# Altium schematic symbol library IC_ADI.SCHLIB: 3169 symbols (part 4 of 181)
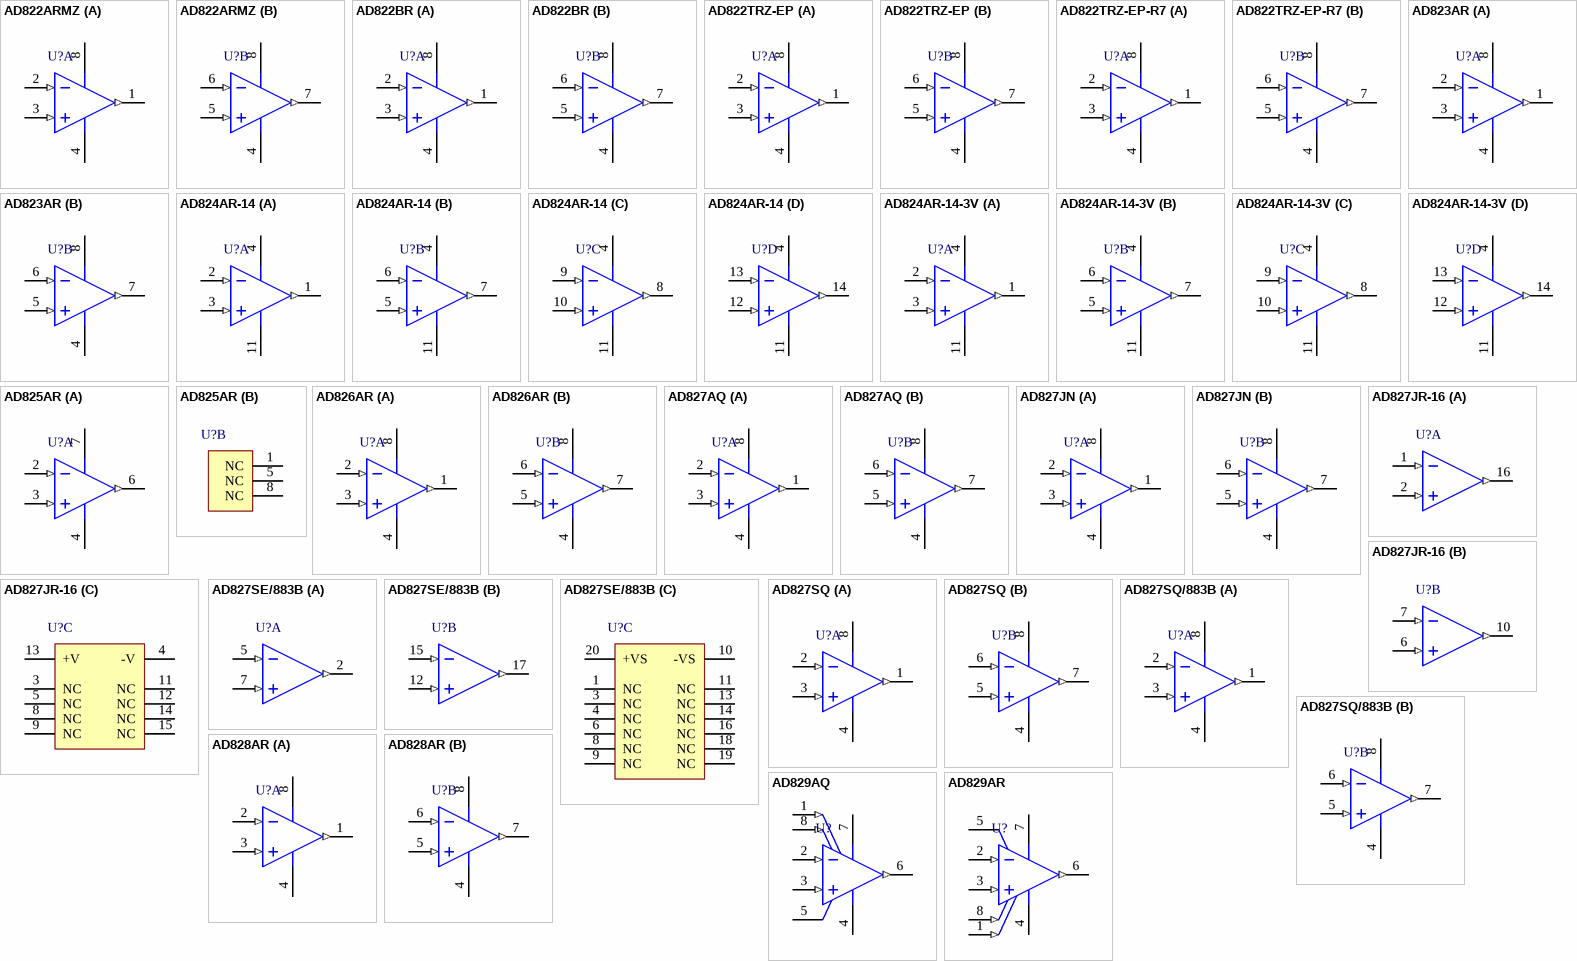
[diagram p194: symbols AD822ARMZ to AD829AR]

## AD825AR
designator U?
Single Channel Low Distortion Operational Amplifier, 46 MHz BW, 140 V/us SR, Industrial, 8-pin SOIC (R-8), Tube; Generic Part Number: AD825; PartNumber: AD825AR; Amplifiers Per Package: 1; Input Bias Current: 10pA; Input Offset Voltage: 1mV; Iq/Amp: 7.2mA; Small Signal Bandwidth: 46MHz; V Span Max: 36V; V Span Min: 10V; DatasheetVersion: Rev. F; PackageVersion: 060506-A; PackageReference: R-8; PackageDescription: 8-Pin Standard Small Outline Package, Body 3.9 x 4.9 mm, Pitch 1.27 mm; Supplier Part Number 1: AD825AR-ND; Packing: Tube; Slew Rate: 140V/us; Mounting Technology: Surface Mount; Code_JEDEC: MS-012-AA; ComponentLink1Description: Manufacturer URL; ComponentLink2Description: Datasheet; ComponentLink3Description: Package Specification
footprint SOIC8_1.27 (Footprint not found)
part A pins: 2 -IN (in), 3 +IN (in), 4 -VS (power), 6 OUT (out), 7 +VS (power)
part B pins: 1 NC, 5 NC, 8 NC

## AD826AR
designator U?
Double Channel Low Power Operational Amplifier, 50 MHz BW, 350 V/us SR, Industrial, 8-pin SOIC (R-8), Tube; Generic Part Number: AD826; PartNumber: AD826AR; Amplifiers Per Package: 2; Input Bias Current: 3.3uA; Input Offset Voltage: 500uV; Iq/Amp: 7.5mA; Small Signal Bandwidth: 50MHz; V Span Max: 36V; V Span Min: 5V; DatasheetVersion: Rev. C; PackageVersion: 060506-A; PackageReference: R-8; PackageDescription: 8-Pin Standard Small Outline Package, Body 3.9 x 4.9 mm, Pitch 1.27 mm; Supplier Part Number 1: AD826AR-ND; Slew Rate: 350V/us; Mounting Technology: Surface Mount; Code_JEDEC: MS-012-AA; ComponentLink1Description: Manufacturer URL; ComponentLink2Description: Datasheet; ComponentLink3Description: Package Specification
footprint SOIC8_1.27 (Footprint not found)
pins on every part: 4 -V (power), 8 +V (power)
part A pins: 1 OUT 1 (out), 2 -IN 1 (in), 3 +IN 1 (in)
part B pins: 5 +IN 2 (in), 6 -IN 2 (in), 7 OUT 2 (out)

## AD827AQ
designator U?
Double Channel Low Power Operational Amplifier, 50 MHz BW, 300 V/us SR, Industrial, 8-pin DIP (Q-8), Tube; Generic Part Number: AD827; PartNumber: AD827AQ; Amplifiers Per Package: 2; Input Bias Current: 3.3uA; Input Offset Voltage: 500uV; Iq/Amp: 6.75mA; Small Signal Bandwidth: 50MHz; V Span Max: 36V; V Span Min: 9V; DatasheetVersion: Rev. C; PackageReference: Q-8; PackageDescription: 8-Pin Ceramic Dual In-Line Package, Row spacing 7.62 mm, Pitch 2.54 mm; Supplier Part Number 1: AD827AQ-ND; Supplier Part Number 2: 09B6522; Packing: Tube; Slew Rate: 300V/us; Mounting Technology: Through Hole; ComponentLink1Description: Manufacturer URL; ComponentLink2Description: Datasheet; ComponentLink3Description: Package Specification
footprint DIP8 (Footprint not found)
pins on every part: 4 -V (power), 8 +V (power)
part A pins: 1 OUT 1 (out), 2 -IN 1 (in), 3 +IN 1 (in)
part B pins: 5 +IN 2 (in), 6 -IN 2 (in), 7 OUT 2 (out)

## AD827JN
designator U?
Double Channel Low Power Operational Amplifier, 50 MHz BW, 300 V/us SR, Commercial, 8-pin DIP (N-8), Tube; Generic Part Number: AD827; PartNumber: AD827JN; Amplifiers Per Package: 2; Input Bias Current: 3.3uA; Input Offset Voltage: 500uV; Iq/Amp: 6.75mA; Small Signal Bandwidth: 50MHz; V Span Max: 36V; V Span Min: 9V; DatasheetVersion: Rev. C; PackageVersion: 070606-A; PackageReference: N-8; PackageDescription: 8-Pin Plastic Dual In-Line Package, Row spacing 7.62 mm, Pitch 2.54 mm; Supplier Part Number 1: AD827JN-ND; Packing: Tube; Slew Rate: 300V/us; Mounting Technology: Through Hole; Code_JEDEC: MS-001; ComponentLink1Description: Manufacturer URL; ComponentLink2Description: Datasheet; ComponentLink3Description: Package Specification
footprint DIP8 (Footprint not found)
pins on every part: 4 -V (power), 8 +V (power)
part A pins: 1 OUT 1 (out), 2 -IN 1 (in), 3 +IN 1 (in)
part B pins: 5 +IN 2 (in), 6 -IN 2 (in), 7 OUT 2 (out)

## AD827JR-16
designator U?
Double Channel Low Power Operational Amplifier, 50 MHz BW, 300 V/us SR, Commercial, 16-pin SOIC (RW-16), Tube; Generic Part Number: AD827; PartNumber: AD827JR-16; Amplifiers Per Package: 2; Input Bias Current: 3.3uA; Input Offset Voltage: 500uV; Iq/Amp: 6.75mA; Small Signal Bandwidth: 50MHz; V Span Max: 36V; V Span Min: 9V; DatasheetVersion: Rev. C; PackageVersion: 032707-B; PackageReference: RW-16; PackageDescription: 16-Pin Standard Small Outline Package, Body 10.3 x 7.5 mm, Pitch 1.27 mm; Supplier Part Number 1: AD827JR-16-ND; Supplier Part Number 2: 05F7691; Packing: Tube; Slew Rate: 300V/us; Mounting Technology: Surface Mount; Code_JEDEC: MS-013-AA; ComponentLink1Description: Manufacturer URL; ComponentLink2Description: Datasheet; ComponentLink3Description: Package Specification
footprint SOIC16W_1.27 (Footprint not found)
part A pins: 1 -IN 1 (in), 2 +IN 1 (in), 16 OUT 1 (out)
part B pins: 6 +IN 2 (in), 7 -IN 2 (in), 10 OUT 2 (out)
part C pins: 3 NC, 4 -V (power), 5 NC, 8 NC, 9 NC, 11 NC, 12 NC, 13 +V (power), 14 NC, 15 NC

## AD827SE/883B
designator U?
Double Channel Low Power Operational Amplifier, 50 MHz BW, 300 V/us SR, Military, 20-pin LCC (E-20A), Tube; Generic Part Number: AD827; PartNumber: AD827SE/883B; Amplifiers Per Package: 2; Input Bias Current: 3.3uA; Input Offset Voltage: 500uV; Iq/Amp: 6.75mA; Small Signal Bandwidth: 50MHz; V Span Max: 36V; V Span Min: 9V; DatasheetVersion: Rev. C; PackageVersion: Rev. C; PackageReference: E-20A; PackageDescription: 20-Pin Terminal Ceramic Leadless Chip Carrier, Body 8.89 x 8.89 mm, Pitch 1.27 mm; Supplier Part Number 1: AD827SE/883B-ND; Packing: Tube; Slew Rate: 300V/us; Mounting Technology: Surface Mount; ComponentLink1Description: Manufacturer URL; ComponentLink2Description: Datasheet; ComponentLink3Description: Package Specification
footprint PLCC-20N (Footprint not found)
part A pins: 2 OUTPUT A (out), 5 -IN A (in), 7 +IN A (in)
part B pins: 12 +IN B (in), 15 -IN B (in), 17 OUTPUT B (out)
part C pins: 1 NC, 3 NC, 4 NC, 6 NC, 8 NC, 9 NC, 10 -VS (power), 11 NC, 13 NC, 14 NC, 16 NC, 18 NC, 19 NC, 20 +VS (power)

## AD827SQ
designator U?
Double Channel Low Power Operational Amplifier, 50 MHz BW, 300 V/us SR, Military, 8-pin DIP (Q-8), Tube; Generic Part Number: AD827; PartNumber: AD827SQ; Amplifiers Per Package: 2; Input Bias Current: 3.3uA; Input Offset Voltage: 500uV; Iq/Amp: 6.75mA; Small Signal Bandwidth: 50MHz; V Span Max: 36V; V Span Min: 9V; DatasheetVersion: Rev. C; PackageReference: Q-8; PackageDescription: 8-Pin Ceramic Dual In-Line Package, Row spacing 7.62 mm, Pitch 2.54 mm; Supplier Part Number 1: AD827SQ-ND; Packing: Tube; Slew Rate: 300V/us; Mounting Technology: Through Hole; ComponentLink1Description: Manufacturer URL; ComponentLink2Description: Datasheet; ComponentLink3Description: Package Specification
footprint DIP8 (Footprint not found)
pins on every part: 4 -V (power), 8 +V (power)
part A pins: 1 OUT 1 (out), 2 -IN 1 (in), 3 +IN 1 (in)
part B pins: 5 +IN 2 (in), 6 -IN 2 (in), 7 OUT 2 (out)

## AD827SQ/883B
designator U?
Double Channel Low Power Operational Amplifier, 50 MHz BW, 300 V/us SR, Military, 8-pin DIP (Q-8), Tube; Generic Part Number: AD827; PartNumber: AD827SQ/883B; Amplifiers Per Package: 2; Input Bias Current: 3.3uA; Input Offset Voltage: 500uV; Iq/Amp: 6.75mA; Small Signal Bandwidth: 50MHz; V Span Max: 36V; V Span Min: 9V; DatasheetVersion: Rev. C; PackageReference: Q-8; PackageDescription: 8-Pin Ceramic Dual In-Line Package, Row spacing 7.62 mm, Pitch 2.54 mm; Supplier Part Number 1: AD827SQ/883B-ND; Packing: Tube; Slew Rate: 300V/us; Mounting Technology: Through Hole; ComponentLink1Description: Manufacturer URL; ComponentLink2Description: Datasheet; ComponentLink3Description: Package Specification
footprint DIP8 (Footprint not found)
pins on every part: 4 -V (power), 8 +V (power)
part A pins: 1 OUT 1 (out), 2 -IN 1 (in), 3 +IN 1 (in)
part B pins: 5 +IN 2 (in), 6 -IN 2 (in), 7 OUT 2 (out)

## AD828AR
designator U?
Double Channel Low Power Operational Amplifier, 130 MHz BW, 450 V/us SR, Industrial, 8-pin SOIC (R-8), Tube; Generic Part Number: AD828; PartNumber: AD828AR; Amplifiers Per Package: 2; Input Bias Current: 3.3uA; Input Offset Voltage: 500uV; Iq/Amp: 7.5mA; Small Signal Bandwidth: 130MHz; V Span Max: 36V; V Span Min: 5V; DatasheetVersion: Rev. C; PackageVersion: 060506-A; PackageReference: R-8; PackageDescription: 8-Pin Standard Small Outline Package, Body 3.9 x 4.9 mm, Pitch 1.27 mm; Supplier Part Number 1: AD828AR-ND; Slew Rate: 450V/us; Mounting Technology: Surface Mount; Code_JEDEC: MS-012-AA; ComponentLink1Description: Manufacturer URL; ComponentLink2Description: Datasheet; ComponentLink3Description: Package Specification
footprint SOIC8_1.27 (Footprint not found)
pins on every part: 4 -V (power), 8 +V (power)
part A pins: 1 OUT 1 (out), 2 -IN 1 (in), 3 +IN 1 (in)
part B pins: 5 +IN 2 (in), 6 -IN 2 (in), 7 OUT 2 (out)

## AD829AQ
designator U?
Single Channel Low Noise Operational Amplifier, 120 MHz BW, 230 V/us SR, Industrial, 8-pin DIP (Q-8), Tube; Generic Part Number: AD829; PartNumber: AD829AQ; Amplifiers Per Package: 1; Input Bias Current: 3.3uA; Input Offset Voltage: 100uV; Iq/Amp: 6.5mA; Small Signal Bandwidth: 120MHz; V Span Max: 36V; V Span Min: 9V; DatasheetVersion: Rev. I; PackageReference: Q-8; PackageDescription: 8-Pin Ceramic Dual In-Line Package, Row spacing 7.62 mm, Pitch 2.54 mm; Supplier Part Number 1: AD829AQ-ND; Supplier Part Number 2: 05F7694; Packing: Tube; Slew Rate: 230V/us; Mounting Technology: Through Hole; ComponentLink1Description: Manufacturer URL; ComponentLink2Description: Datasheet; ComponentLink3Description: Package Specification
footprint DIP8 (Footprint not found)
pins: 1 OFFSET NULL (in), 2 -IN (in), 3 +IN (in), 4 -VS (power), 5 CCOMP, 6 OUT (out), 7 +VS (power), 8 OFFSET NULL (in)

## AD829AR
designator U?
Single Channel Low Noise Operational Amplifier, 120 MHz BW, 230 V/us SR, Industrial, 8-pin SOIC (R-8), Tube; Generic Part Number: AD829; PartNumber: AD829AR; Amplifiers Per Package: 1; Input Bias Current: 3.3uA; Input Offset Voltage: 200uV; Iq/Amp: 6.5mA; Small Signal Bandwidth: 120MHz; V Span Max: 36V; V Span Min: 9V; DatasheetVersion: Rev. I; PackageVersion: 060506-A; PackageReference: R-8; PackageDescription: 8-Pin Standard Small Outline Package, Body 3.9 x 4.9 mm, Pitch 1.27 mm; Supplier Part Number 1: AD829AR-ND; Packing: Tube; Slew Rate: 230V/us; Mounting Technology: Surface Mount; Code_JEDEC: MS-012-AA; ComponentLink1Description: Manufacturer URL; ComponentLink2Description: Datasheet; ComponentLink3Description: Package Specification
footprint SOIC8_1.27 (Footprint not found)
pins: 1 OFFSET NULL (in), 2 -IN (in), 3 +IN (in), 4 -VS (power), 5 CCOMP, 6 OUT (out), 7 +VS (power), 8 OFFSET NULL (in)

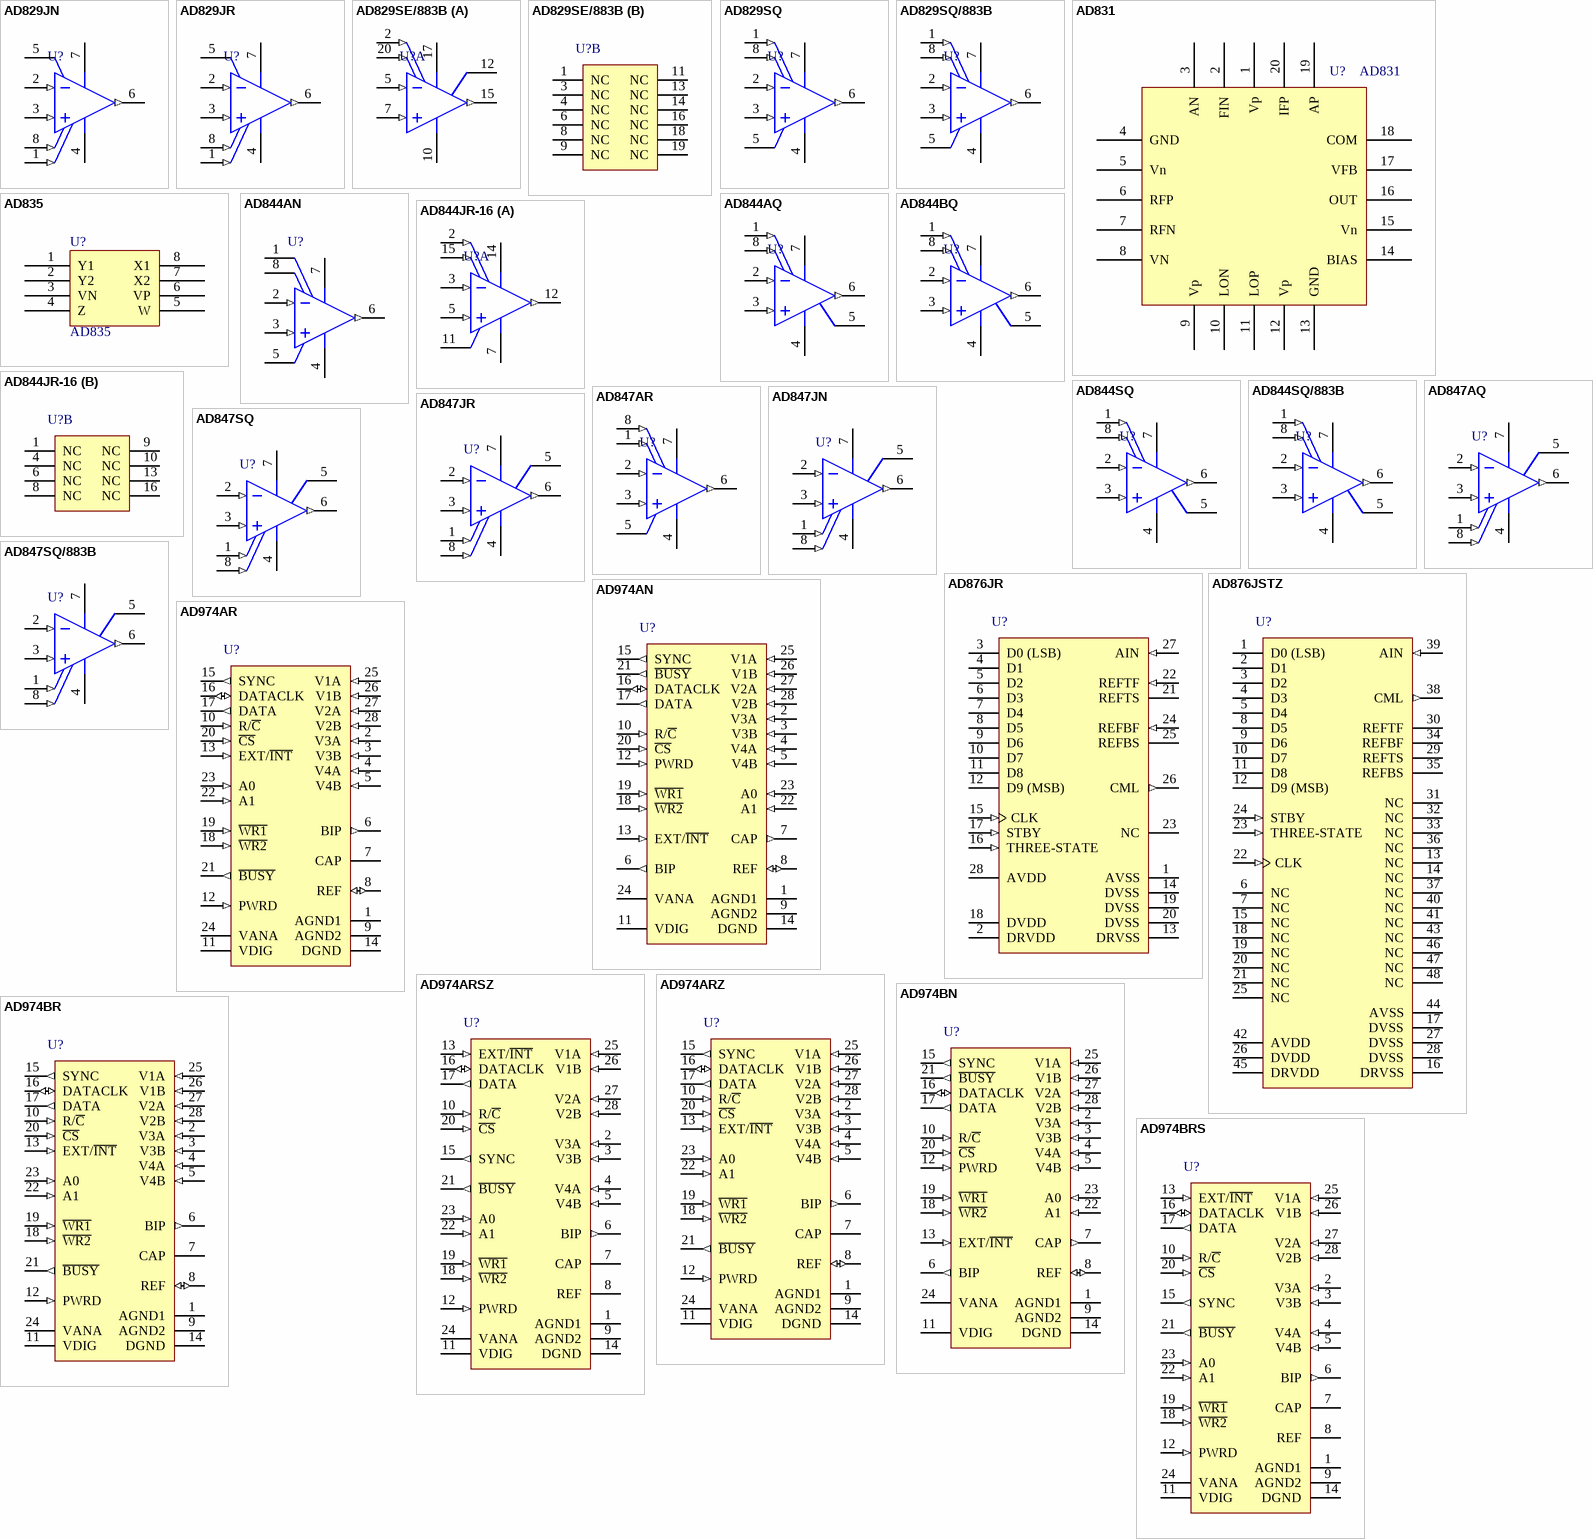
[diagram p8: symbols AD829JN to AD974BRS]

## AD829JN
designator U?
Single Channel Low Noise Operational Amplifier, 120 MHz BW, 230 V/us SR, Commercial, 8-pin DIP (N-8), Tube; Generic Part Number: AD829; PartNumber: AD829JN; Amplifiers Per Package: 1; Input Bias Current: 3.3uA; Input Offset Voltage: 200uV; Iq/Amp: 6.5mA; Small Signal Bandwidth: 120MHz; V Span Max: 36V; V Span Min: 9V; DatasheetVersion: Rev. I; PackageVersion: 070606-A; PackageReference: N-8; PackageDescription: 8-Pin Plastic Dual In-Line Package, Row spacing 7.62 mm, Pitch 2.54 mm; Supplier Part Number 1: AD829JN-ND; Packing: Tube; Slew Rate: 230V/us; Mounting Technology: Through Hole; Code_JEDEC: MS-001; ComponentLink1Description: Manufacturer URL; ComponentLink2Description: Datasheet; ComponentLink3Description: Package Specification
footprint DIP8 (Footprint not found)
pins: 1 OFFSET NULL (in), 2 -IN (in), 3 +IN (in), 4 -VS (power), 5 CCOMP, 6 OUT (out), 7 +VS (power), 8 OFFSET NULL (in)

## AD829JR
designator U?
Single Channel Low Noise Operational Amplifier, 120 MHz BW, 230 V/us SR, Commercial, 8-pin SOIC (R-8), Tube; Generic Part Number: AD829; PartNumber: AD829JR; Amplifiers Per Package: 1; Input Bias Current: 3.3uA; Input Offset Voltage: 200uV; Iq/Amp: 6.5mA; Small Signal Bandwidth: 120MHz; V Span Max: 36V; V Span Min: 9V; DatasheetVersion: Rev. I; PackageVersion: 060506-A; PackageReference: R-8; PackageDescription: 8-Pin Standard Small Outline Package, Body 3.9 x 4.9 mm, Pitch 1.27 mm; Supplier Part Number 1: AD829JR-ND; Packing: Tube; Slew Rate: 230V/us; Mounting Technology: Surface Mount; Code_JEDEC: MS-012-AA; ComponentLink1Description: Manufacturer URL; ComponentLink2Description: Datasheet; ComponentLink3Description: Package Specification
footprint SOIC8_1.27 (Footprint not found)
pins: 1 OFFSET NULL (in), 2 -IN (in), 3 +IN (in), 4 -VS (power), 5 CCOMP, 6 OUT (out), 7 +VS (power), 8 OFFSET NULL (in)

## AD829SE/883B
designator U?
Single Channel Low Noise Operational Amplifier, 120 MHz BW, 230 V/us SR, Military, 20-pin LCC (E-20-1), Tube; Generic Part Number: AD829; PartNumber: AD829SE/883B; Amplifiers Per Package: 1; Input Bias Current: 3.3uA; Input Offset Voltage: 100uV; Iq/Amp: 6.5mA; Small Signal Bandwidth: 120MHz; V Span Max: 36V; V Span Min: 9V; DatasheetVersion: Rev. I; PackageVersion: 022106-A; PackageReference: E-20-1; PackageDescription: 20-Terminal Ceramic Leadless Chip Carrier, Body 8.89 x 8.89 mm, Pitch 1.27 mm; Supplier Part Number 1: AD829SE/883B-ND; Packing: Tube; Slew Rate: 230V/us; Mounting Technology: Surface Mount; ComponentLink1Description: Manufacturer URL; ComponentLink2Description: Datasheet; ComponentLink3Description: Package Specification
footprint PLCC-20N (Footprint not found)
part A pins: 2 OFFSET NULL (in), 5 -IN (in), 7 +IN (in), 10 -V (power), 12 CCOMP, 15 OUT (out), 17 +V (power), 20 OFFSET NULL (in)
part B pins: 1 NC, 3 NC, 4 NC, 6 NC, 8 NC, 9 NC, 11 NC, 13 NC, 14 NC, 16 NC, 18 NC, 19 NC

## AD829SQ
designator U?
Single Channel Low Noise Operational Amplifier, 120 MHz BW, 230 V/us SR, Military, 8-pin DIP (Q-8), Tube; Generic Part Number: AD829; PartNumber: AD829SQ; Amplifiers Per Package: 1; Input Bias Current: 3.3uA; Input Offset Voltage: 100uV; Iq/Amp: 6.5mA; Small Signal Bandwidth: 120MHz; V Span Max: 36V; V Span Min: 9V; DatasheetVersion: Rev. I; PackageReference: Q-8; PackageDescription: 8-Pin Ceramic Dual In-Line Package, Row spacing 7.62 mm, Pitch 2.54 mm; Supplier Part Number 1: AD829SQ-ND; Supplier Part Number 2: 02H1879; Packing: Tube; Slew Rate: 230V/us; Mounting Technology: Through Hole; ComponentLink1Description: Manufacturer URL; ComponentLink2Description: Datasheet; ComponentLink3Description: Package Specification
footprint DIP8 (Footprint not found)
pins: 1 OFFSET NULL (in), 2 -IN (in), 3 +IN (in), 4 -VS (power), 5 CCOMP, 6 OUT (out), 7 +VS (power), 8 OFFSET NULL (in)

## AD829SQ/883B
designator U?
Single Channel Low Noise Operational Amplifier, 120 MHz BW, 230 V/us SR, Military, 8-pin DIP (Q-8), Tube; Generic Part Number: AD829; PartNumber: AD829SQ/883B; Amplifiers Per Package: 1; Input Bias Current: 3.3uA; Input Offset Voltage: 100uV; Iq/Amp: 6.5mA; Small Signal Bandwidth: 120MHz; V Span Max: 36V; V Span Min: 9V; DatasheetVersion: Rev. I; PackageReference: Q-8; PackageDescription: 8-Pin Ceramic Dual In-Line Package, Row spacing 7.62 mm, Pitch 2.54 mm; Supplier Part Number 1: AD829SQ/883B-ND; Packing: Tube; Slew Rate: 230V/us; Mounting Technology: Through Hole; ComponentLink1Description: Manufacturer URL; ComponentLink2Description: Datasheet; ComponentLink3Description: Package Specification
footprint DIP8 (Footprint not found)
pins: 1 OFFSET NULL (in), 2 -IN (in), 3 +IN (in), 4 -VS (power), 5 CCOMP, 6 OUT (out), 7 +VS (power), 8 OFFSET NULL (in)

## AD831
designator U?
footprint PLCC-20N (PLCC, 44-Leads, Body 17.6x17.6mm (max), Pitch 1.270mm, IPC Medium Density)
pins: 1 Vp, 2 FIN, 3 AN, 4 GND, 5 Vn, 6 RFP, 7 RFN, 8 VN, 9 Vp, 10 LON, 11 LOP, 12 Vp, 13 GND, 14 BIAS, 15 Vn, 16 OUT, 17 VFB, 18 COM, 19 AP, 20 IFP

## AD835
designator U?
footprint SOIC8_1.27 (SOP, 8-Leads, Pitch 1.27mm)
pins: 1 Y1, 2 Y2, 3 VN, 4 Z, 5 W, 6 VP, 7 X2, 8 X1

## AD844AN
designator U?
Single Channel Wide Bandwidth Operational Amplifier, 60 MHz BW, 2 KV/us SR, Industrial, 8-pin DIP (N-8), Tube; Generic Part Number: AD844; PartNumber: AD844AN; Amplifiers Per Package: 1; Input Bias Current: 150nA; Input Offset Voltage: 50uV; Iq/Amp: 6.5mA; Slew Rate: 2KV/us; Small Signal Bandwidth: 60MHz; V Span Max: 36V; V Span Min: 9V; DatasheetVersion: Rev. F; PackageVersion: 070606-A; PackageReference: N-8; PackageDescription: 8-Pin Plastic Dual In-Line Package, Row spacing 7.62 mm, Pitch 2.54 mm; Supplier Part Number 1: AD844AN-ND; Packing: Tube; Mounting Technology: Through Hole; Code_JEDEC: MS-001; ComponentLink1Description: Manufacturer URL; ComponentLink2Description: Datasheet; ComponentLink3Description: Package Specification
footprint DIP8 (Footprint not found)
pins: 1 NULL, 2 -IN (in), 3 +IN (in), 4 -VS (power), 5 TZ, 6 OUTPUT (out), 7 +VS (power), 8 NULL

## AD844AQ
designator U?
Single Channel Wide Bandwidth Operational Amplifier, 60 MHz BW, 2 KV/us SR, Industrial, 8-pin DIP (Q-8), Tube; Generic Part Number: AD844; PartNumber: AD844AQ; Amplifiers Per Package: 1; Input Bias Current: 150nA; Input Offset Voltage: 50uV; Iq/Amp: 6.5mA; Slew Rate: 2KV/us; Small Signal Bandwidth: 60MHz; V Span Max: 36V; V Span Min: 9V; DatasheetVersion: Rev. F; PackageReference: Q-8; PackageDescription: 8-Pin Ceramic Dual In-Line Package, Row spacing 7.62 mm, Pitch 2.54 mm; Supplier Part Number 1: AD844AQ-ND; Supplier Part Number 2: 09B6611; Packing: Tube; Mounting Technology: Through Hole; ComponentLink1Description: Manufacturer URL; ComponentLink2Description: Datasheet; ComponentLink3Description: Package Specification
footprint DIP8 (Footprint not found)
pins: 1 NULL (in), 2 -IN (in), 3 +IN (in), 4 -VS (power), 5 TZ, 6 OUT (out), 7 +VS (power), 8 NULL (in)

## AD844BQ
designator U?
Single Channel Wide Bandwidth Operational Amplifier, 60 MHz BW, 2 KV/us SR, Industrial, 8-pin DIP (Q-8), Tube; Generic Part Number: AD844; PartNumber: AD844BQ; Amplifiers Per Package: 1; Input Bias Current: 100nA; Input Offset Voltage: 50uV; Iq/Amp: 6.5mA; Slew Rate: 2KV/us; Small Signal Bandwidth: 60MHz; V Span Max: 36V; V Span Min: 9V; DatasheetVersion: Rev. F; PackageReference: Q-8; PackageDescription: 8-Pin Ceramic Dual In-Line Package, Row spacing 7.62 mm, Pitch 2.54 mm; Supplier Part Number 1: AD844BQ-ND; Supplier Part Number 2: 16F6548; Packing: Tube; Mounting Technology: Through Hole; ComponentLink1Description: Manufacturer URL; ComponentLink2Description: Datasheet; ComponentLink3Description: Package Specification
footprint DIP8 (Footprint not found)
pins: 1 NULL (in), 2 -IN (in), 3 +IN (in), 4 -VS (power), 5 TZ, 6 OUT (out), 7 +VS (power), 8 NULL (in)

## AD844JR-16
designator U?
Single Channel Wide Bandwidth Operational Amplifier, 60 MHz BW, 2 KV/us SR, Commercial, 16-pin SOIC (RW-16), Tube; Generic Part Number: AD844; PartNumber: AD844JR-16; Amplifiers Per Package: 1; Input Bias Current: 150nA; Input Offset Voltage: 50uV; Iq/Amp: 6.5mA; Slew Rate: 2KV/us; Small Signal Bandwidth: 60MHz; V Span Max: 36V; V Span Min: 9V; DatasheetVersion: Rev. F; PackageVersion: 032707-B; PackageReference: RW-16; PackageDescription: 16-Pin Standard Small Outline Package, Body 10.3 x 7.5 mm, Pitch 1.27 mm; Supplier Part Number 1: AD844JR-16-ND; Packing: Tube; Mounting Technology: Surface Mount; Code_JEDEC: MS-013-AA; ComponentLink1Description: Manufacturer URL; ComponentLink2Description: Datasheet; ComponentLink3Description: Package Specification
footprint SOIC16W_1.27 (Footprint not found)
part A pins: 2 OFFSET NULL (in), 3 -IN (in), 5 +IN (in), 7 -V (power), 11 TZ, 12 OUT (out), 14 +V (power), 15 OFFSET NULL (in)
part B pins: 1 NC, 4 NC, 6 NC, 8 NC, 9 NC, 10 NC, 13 NC, 16 NC

## AD844SQ
designator U?
Single Channel Wide Bandwidth Operational Amplifier, 60 MHz BW, 2 KV/us SR, Military, 8-pin DIP (Q-8), Tube; Generic Part Number: AD844; PartNumber: AD844SQ; Amplifiers Per Package: 1; Input Bias Current: 100nA; Input Offset Voltage: 50uV; Iq/Amp: 6.5mA; Slew Rate: 2KV/us; Small Signal Bandwidth: 60MHz; V Span Max: 36V; V Span Min: 9V; DatasheetVersion: Rev. F; PackageReference: Q-8; PackageDescription: 8-Pin Ceramic Dual In-Line Package, Row spacing 7.62 mm, Pitch 2.54 mm; Supplier Part Number 1: AD844SQ-ND; Supplier Part Number 2: 09B6614; Packing: Tube; Mounting Technology: Through Hole; ComponentLink1Description: Manufacturer URL; ComponentLink2Description: Datasheet; ComponentLink3Description: Package Specification
footprint DIP8 (Footprint not found)
pins: 1 NULL (in), 2 -IN (in), 3 +IN (in), 4 -VS (power), 5 TZ, 6 OUT (out), 7 +VS (power), 8 NULL (in)

## AD844SQ/883B
designator U?
Single Channel Wide Bandwidth Operational Amplifier, 60 MHz BW, 2 KV/us SR, Military, 8-pin DIP (Q-8), Tube; Generic Part Number: AD844; PartNumber: AD844SQ/883B; Amplifiers Per Package: 1; Input Bias Current: 100nA; Input Offset Voltage: 50uV; Iq/Amp: 6.5mA; Slew Rate: 2KV/us; Small Signal Bandwidth: 60MHz; V Span Max: 36V; V Span Min: 9V; DatasheetVersion: Rev. F; PackageReference: Q-8; PackageDescription: 8-Pin Ceramic Dual In-Line Package, Row spacing 7.62 mm, Pitch 2.54 mm; Supplier Part Number 1: 55368S6217635N4771; Supplier Part Number 2: AD844SQ/883B-ND; Packing: Tube; Mounting Technology: Through Hole; ComponentLink1Description: Manufacturer URL; ComponentLink2Description: Datasheet; ComponentLink3Description: Package Specification
footprint DIP8 (Footprint not found)
pins: 1 NULL (in), 2 -IN (in), 3 +IN (in), 4 -VS (power), 5 TZ, 6 OUT (out), 7 +VS (power), 8 NULL (in)

## AD847AQ
designator U?
Single Channel Superior Performance, High Unity Gain Operational Amplifier, 50 MHz BW, 300 V/us SR, Industrial, 8-pin DIP (Q-8), Tube; Generic Part Number: AD847; PartNumber: AD847AQ; Amplifiers Per Package: 1; Input Bias Current: 3.3uA; Input Offset Voltage: 500uV; Iq/Amp: 4.8mA; Small Signal Bandwidth: 50MHz; V Span Max: 36V; V Span Min: 9V; DatasheetVersion: Rev. F; PackageReference: Q-8; PackageDescription: 8-Pin Ceramic Dual In-Line Package, Row spacing 7.62 mm, Pitch 2.54 mm; Supplier Part Number 1: AD847AQ-ND; Supplier Part Number 2: 1464950; Supplier Part Number 3: 05F7723; Packing: Tube; Slew Rate: 300V/us; Mounting Technology: Through Hole; ComponentLink1Description: Manufacturer URL; ComponentLink2Description: Datasheet; ComponentLink3Description: Package Specification
footprint DIP8 (Footprint not found)
pins: 1 NULL (in), 2 -IN (in), 3 +IN (in), 4 -VS (power), 5 NC, 6 OUT (out), 7 +VS (power), 8 NULL (in)

## AD847AR
designator U?
Single Channel Superior Performance, High Unity Gain Operational Amplifier, 50 MHz BW, 300 V/us SR, Industrial, 8-pin SOIC (R-8), Tube; Generic Part Number: AD847; PartNumber: AD847AR; Amplifiers Per Package: 1; Input Bias Current: 3.3uA; Input Offset Voltage: 500uV; Iq/Amp: 4.8mA; Small Signal Bandwidth: 50MHz; V Span Max: 36V; V Span Min: 9V; DatasheetVersion: Rev. F; PackageVersion: 060506-A; PackageReference: R-8; PackageDescription: 8-Pin Standard Small Outline Package, Body 3.9 x 4.9 mm, Pitch 1.27 mm; Supplier Part Number 1: AD847AR-ND; Packing: Tube; Slew Rate: 300V/us; Mounting Technology: Surface Mount; Code_JEDEC: MS-012-AA; ComponentLink1Description: Manufacturer URL; ComponentLink2Description: Datasheet; ComponentLink3Description: Package Specification
footprint SOIC8_1.27 (Footprint not found)
pins: 1 NULL (in), 2 -IN (in), 3 +IN (in), 4 -VS (power), 5 NC, 6 OUT (out), 7 +VS (power), 8 NULL (in)

## AD847JN
designator U?
Single Channel Superior Performance, High Unity Gain Operational Amplifier, 50 MHz BW, 300 V/us SR, Commercial, 8-pin DIP (N-8), Tube; Generic Part Number: AD847; PartNumber: AD847JN; Amplifiers Per Package: 1; Input Bias Current: 3.3uA; Input Offset Voltage: 500uV; Iq/Amp: 4.8mA; Small Signal Bandwidth: 50MHz; V Span Max: 36V; V Span Min: 9V; DatasheetVersion: Rev. F; PackageVersion: 070606-A; PackageReference: N-8; PackageDescription: 8-Pin Plastic Dual In-Line Package, Row spacing 7.62 mm, Pitch 2.54 mm; Supplier Part Number 1: AD847JN-ND; Packing: Tube; Slew Rate: 300V/us; Mounting Technology: Through Hole; Code_JEDEC: MS-001; ComponentLink1Description: Manufacturer URL; ComponentLink2Description: Datasheet; ComponentLink3Description: Package Specification
footprint DIP8 (Footprint not found)
pins: 1 NULL (in), 2 -IN (in), 3 +IN (in), 4 -VS (power), 5 NC, 6 OUT (out), 7 +VS (power), 8 NULL (in)

## AD847JR
designator U?
Single Channel Superior Performance, High Unity Gain Operational Amplifier, 50 MHz BW, 300 V/us SR, Commercial, 8-pin SOIC (R-8), Tube; Generic Part Number: AD847; PartNumber: AD847JR; Amplifiers Per Package: 1; Input Bias Current: 3.3uA; Input Offset Voltage: 500uV; Iq/Amp: 4.8mA; Small Signal Bandwidth: 50MHz; V Span Max: 36V; V Span Min: 9V; DatasheetVersion: Rev. F; PackageVersion: 060506-A; PackageReference: R-8; PackageDescription: 8-Pin Standard Small Outline Package, Body 3.9 x 4.9 mm, Pitch 1.27 mm; Supplier Part Number 1: AD847JR-ND; Packing: Tube; Slew Rate: 300V/us; Mounting Technology: Surface Mount; Code_JEDEC: MS-012-AA; ComponentLink1Description: Manufacturer URL; ComponentLink2Description: Datasheet; ComponentLink3Description: Package Specification
footprint SOIC8_1.27 (Footprint not found)
pins: 1 NULL (in), 2 -IN (in), 3 +IN (in), 4 -VS (power), 5 NC, 6 OUT (out), 7 +VS (power), 8 NULL (in)

## AD847SQ
designator U?
Single Channel Superior Performance, High Unity Gain Operational Amplifier, 50 MHz BW, 300 V/us SR, Military, 8-pin DIP (Q-8), Tube; Generic Part Number: AD847; PartNumber: AD847SQ; Amplifiers Per Package: 1; Input Bias Current: 3.3uA; Input Offset Voltage: 500uV; Iq/Amp: 4.8mA; Small Signal Bandwidth: 50MHz; V Span Max: 36V; V Span Min: 9V; DatasheetVersion: Rev. F; PackageReference: Q-8; PackageDescription: 8-Pin Ceramic Dual In-Line Package, Row spacing 7.62 mm, Pitch 2.54 mm; Supplier Part Number 1: AD847SQ-ND; Supplier Part Number 2: 05F7726; Packing: Tube; Slew Rate: 300V/us; Mounting Technology: Through Hole; ComponentLink1Description: Manufacturer URL; ComponentLink2Description: Datasheet; ComponentLink3Description: Package Specification
footprint DIP8 (Footprint not found)
pins: 1 NULL (in), 2 -IN (in), 3 +IN (in), 4 -VS (power), 5 NC, 6 OUT (out), 7 +VS (power), 8 NULL (in)

## AD847SQ/883B
designator U?
Single Channel Superior Performance, High Unity Gain Operational Amplifier, 50 MHz BW, 300 V/us SR, Military, 8-pin DIP (Q-8), Tube; Generic Part Number: AD847; PartNumber: AD847SQ/883B; Amplifiers Per Package: 1; Input Bias Current: 3.3uA; Input Offset Voltage: 500uV; Iq/Amp: 4.8mA; Small Signal Bandwidth: 50MHz; V Span Max: 36V; V Span Min: 9V; DatasheetVersion: Rev. F; PackageReference: Q-8; PackageDescription: 8-Pin Ceramic Dual In-Line Package, Row spacing 7.62 mm, Pitch 2.54 mm; Supplier Part Number 1: AD847SQ/883B-ND; Packing: Tube; Slew Rate: 300V/us; Mounting Technology: Through Hole; ComponentLink1Description: Manufacturer URL; ComponentLink2Description: Datasheet; ComponentLink3Description: Package Specification
footprint DIP8 (Footprint not found)
pins: 1 NULL (in), 2 -IN (in), 3 +IN (in), 4 -VS (power), 5 NC, 6 OUT (out), 7 +VS (power), 8 NULL (in)

## AD876JR
designator U?
Single 10-Bit Analog-to-Digital Converter with Parallel Interface, 10-Bit 20 Msps 160 mW, CMOS, 20MSPS, 0 to +70 degC, RW-28, Tube; Generic Part Number: AD876; PartNumber: AD876JR; Resolution (Bits): 10; Channels: 1; Throughput Rate (SPS): 20M; Interface: Par; DatasheetVersion: Rev.B; PackageVersion: 060706-A; PackageReference: RW-28; PackageDescription: 28-Lead Standard Small Outline Package [SOIC_W]; Supplier Part Number 1: AD876JR-ND; Supplier Part Number 2: 66F3267; Supplier Part Number 3: 584-AD876JR; RoHS: N; Packing: Tube; Mounting Technology: Surface Mount; Code_JEDEC: MS-013-AE; ComponentLink1Description: Manufacturer URL; ComponentLink2Description: Datasheet; ComponentLink3Description: Package Specification; ComponentLink4Description: Product URL
footprint SOIC28W_1.27 (Footprint not found)
pins: 1 AVSS (power) "Analog Ground.", 2 DRVDD (power) "+3.3 V/+5 V Digital Supply. Supply for digital input and output buffers.", 3 D0 (LSB) (hiz) "Least Significant Bit.", 4 D1 (hiz) "Data Bit 1.", 5 D2 (hiz) "Data Bit 2.", 6 D3 (hiz) "Data Bit 3.", 7 D4 (hiz) "Data Bit 4.", 8 D5 (hiz) "Data Bit 5.", 9 D6 (hiz) "Data Bit 6.", 10 D7 (hiz) "Data Bit 7.", 11 D8 (hiz) "Data Bit 8.", 12 D9 (MSB) (hiz) "Most Significant Bit.", 13 DRVSS (power) "+3.3 V/+5 V Digital Ground. Ground for digital input and output buffers.", 14 DVSS (power) "Digital Ground.", 15 CLK (in) "Clock Input.", 16 THREE-STATE (in) "THREE-STATE = LOW or N/C: Normal Operating Mode. THREE-STATE = HIGH: High Impedance Outputs", 17 STBY (in) "STBY = LOW or N/C: Normal Operating Mode. STBY = HIGH: Standby Mode", 18 DVDD (power) "+5 V Digital Supply.", 19 DVSS (power) "Digital Ground.", 20 DVSS (power) "Digital Ground.", 21 REFTS "Reference Top Sense.", 22 REFTF (in) "Reference Top Force.", 23 NC "No Connect.", 24 REFBF (in) "Reference Bottom Force.", 25 REFBS "Reference Bottom Sense.", 26 CML (out) "Bypass Pin for an Internal Bias Point.", 27 AIN (in) "Analog Input.", 28 AVDD (power) "+5 V Analog Supply."
